# Altium footprint library MOLEX SMD.PcbLib: 54 footprints (part 2 of 4)
Each footprint in its own frame and in the unit in brackets; x right, y up, seen from the top. Pads: shape width x height; smd on the part's side, far side on the other; paste and mask are expansions set on the pad; w line width, h text height; cw(c..) or ccw(c..) is an arc to the next point about the centre after c.
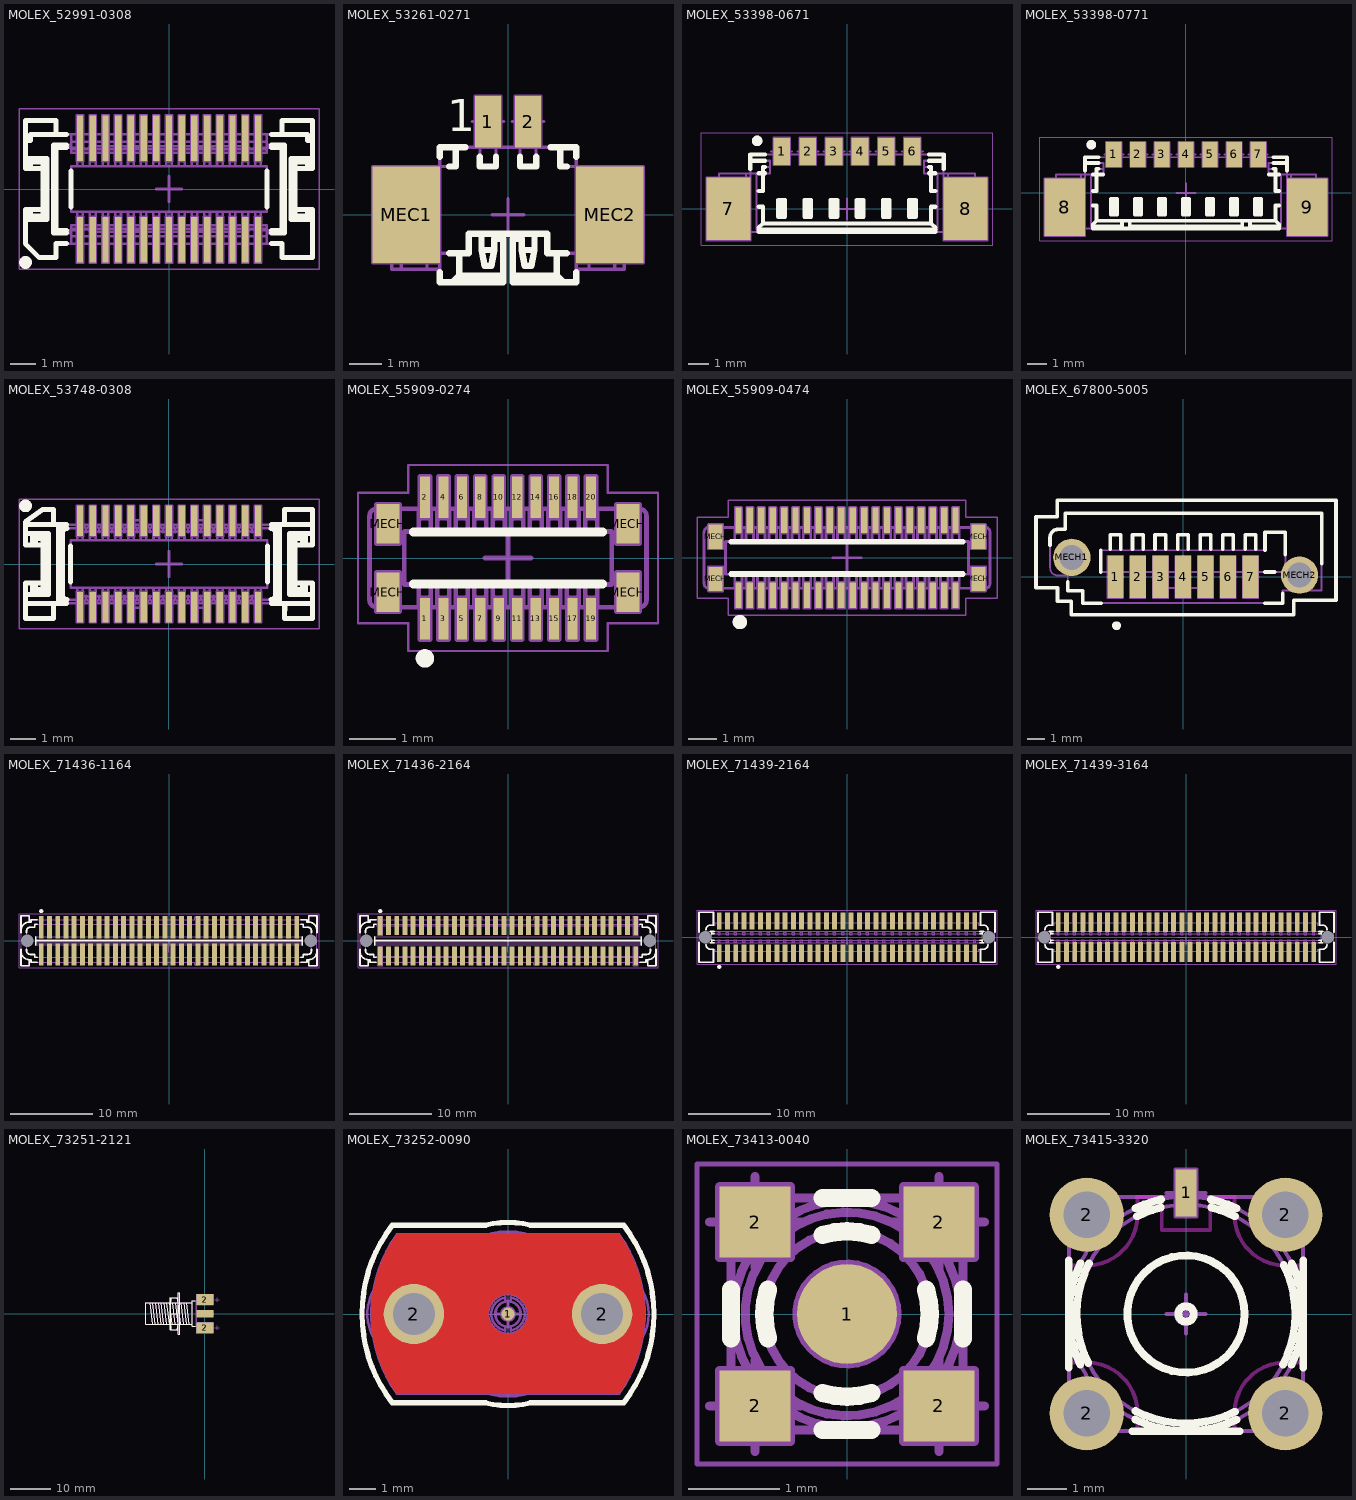
[diagram p1: the footprints below, top view; thin cyan lines are the x and y axes]

## MOLEX_52991-0308 [mm] "0.50mm Pitch SlimStack™ Dual Row 30 Circuits Surface Mount Vertical Receptacle (3.00 and 4.00mm Stacking Heights)"
height 2.27
pads (30):
  rect 0.25x1.8 smd: 1(-3.5,-2) 2(-3.5,2) 3(-3,-2) 4(-3,2) 5(-2.5,-2) 6(-2.5,2) 7(-2,-2) 8(-2,2) 9(-1.5,-2) 10(-1.5,2) 11(-1,-2) 12(-1,2) 13(-0.5,-2) 14(-0.5,2) 15(0,-2) 16(0,2) 17(0.5,-2) 18(0.5,2) 19(1,-2) 20(1,2) 21(1.5,-2) 22(1.5,2) 23(2,-2) 24(2,2) 25(2.5,-2) 26(2.5,2) 27(3,-2) 28(3,2) 29(3.5,-2) 30(3.5,2)
Top Overlay:
  circle w0.25: c-5.644,-2.889 r0.125
  lines w0.2: -5.65,-1.2 -4.81,-1.2 -4.81,1.2 -5.65,1.2 ; -5.65,1.9 -5.45,1.9 -5.45,2.15 -4.45,2.15 ; -5.525,-0.8 -5.525,-1.135 ; -5.525,0.8 -5.525,1.135 ; -5.45,-0.8 -5.45,-1.06 ; -5.45,0.8 -5.45,1.06 ; -4.025,-2.15 -4.45,-2.15 -4.45,-2.7 -5.1,-2.7 -5.65,-2.15 -5.65,-0.8 -4.95,-0.8 ; -4.025,-1.73 -4.55,-1.73 ; -4.025,-1.63 -4.45,-1.63 ; -4.025,1.63 -4.45,1.63 ; -4.025,1.73 -4.55,1.73 ; -4.025,2.15 -4.45,2.15 ; -3.85,-0.7 -3.85,0.7 ; 3.85,-0.7 3.85,0.7 ; 4.025,-2.15 4.45,-2.15 4.45,-2.7 5.65,-2.7 5.65,-0.8 ; 4.025,-1.73 4.55,-1.73 ; 4.025,-1.63 4.45,-1.63 ; 4.025,1.63 4.45,1.63 ; 4.025,1.73 4.55,1.73 ; 4.025,2.15 4.45,2.15 ; 5.45,-0.8 5.45,-1.06 ; 5.45,0.8 5.45,1.06 ; 5.525,-0.8 5.525,-1.135 ; 5.525,0.8 5.525,1.135 ; 5.65,-1.2 4.81,-1.2 4.81,1.2 5.65,1.2 ; 5.65,1.9 5.45,1.9 5.45,2.15 4.45,2.15 ; -5.525,-1.135 -4.875,-1.135 ; -5.525,-1.135 -5.45,-1.06 ; -5.525,1.135 -4.875,1.135 ; -5.525,1.135 -5.45,1.06 ; -5.45,-1.06 -4.95,-1.06 ; -5.45,1.06 -4.95,1.06 ; -4.95,-1.06 -4.95,-0.8 ; -4.95,-1.06 -4.875,-1.135 ; -4.95,-0.8 -4.95,0.8 ; -4.95,0.8 -5.65,0.8 -5.65,2.7 -4.45,2.7 -4.45,2.15 ; -4.95,0.8 -4.95,1.06 ; -4.95,1.06 -4.875,1.135 ; -4.875,-1.135 -4.875,1.135 ; -4.55,-1.73 -4.45,-1.63 ; -4.55,-1.73 -4.55,1.73 ; -4.55,1.73 -4.45,1.63 ; -4.45,-1.63 -4.45,1.63 ; 4.45,-1.63 4.55,-1.73 ; 4.45,-1.63 4.45,1.63 ; 4.45,1.63 4.55,1.73 ; 4.45,2.15 4.45,2.7 5.65,2.7 5.65,0.8 ; 4.55,-1.73 4.55,1.73 ; 4.875,-1.135 5.525,-1.135 ; 4.875,-1.135 4.95,-1.06 ; 4.875,-1.135 4.875,1.135 ; 4.875,1.135 5.525,1.135 ; 4.875,1.135 4.95,1.06 ; 4.95,-1.06 4.95,-0.8 ; 4.95,-1.06 5.45,-1.06 ; 4.95,-0.8 4.95,0.8 ; 4.95,-0.8 5.65,-0.8 ; 4.95,-0.8 5.65,-0.8 ; 4.95,0.8 5.65,0.8 ; 4.95,0.8 5.65,0.8 ; 4.95,0.8 4.95,1.06 ; 4.95,1.06 5.45,1.06 ; 5.45,-1.06 5.525,-1.135 ; 5.45,1.06 5.525,1.135
Mechanical 8:
  drawing of 184 lines, arcs and shapes, not listed
Mechanical 14:
  drawing of 228 lines, arcs and shapes, not listed
Mechanical 15:
  lines w0.05: -5.9,-3.15 -5.9,3.15 5.9,3.15 5.9,-3.15 -5.9,-3.15
3D body "MOLEX_52991-0308.stp": height 2.32, standoff 0, extent -5.65,-2.7 5.65,2.7

## MOLEX_53261-0271 [mm] "1.25mm (.049\") Pitch PicoBlade Surface Mount 2 Circuits Right Angle Header"
height 3.4
pads (4):
  rect 0.8x1.6 smd: 1(-0.625,2.9) 2(0.625,2.9)
  rect 2.1x3 smd: MEC1(-3.175,0) MEC2(3.175,0)
Top Overlay:
  lines w0.2: -2.125,-1.8 -2.125,-2.1 -0.15,-2.1 -0.15,-0.75 -0.425,-0.75 -0.425,-1.1 ; -2.125,1.8 -2.125,2.1 -1.325,2.1 ; -1.825,-1.2 -1.225,-1.2 -1.225,-0.6 1.225,-0.6 1.225,-1.2 1.825,-1.2 ; -1.825,1.5 -1.625,1.5 -1.625,2.1 ; -1.725,-2.1 -1.525,-1.9 ; -1.525,-1.2 -1.525,-1.9 ; -0.875,1.8 -0.875,1.5 -0.375,1.5 -0.375,1.8 ; -0.825,-0.6 -0.825,-1.1 ; -0.15,-1.9 -1.525,-1.9 ; 0.15,-1.9 1.525,-1.9 ; 0.375,1.8 0.375,1.5 0.875,1.5 0.875,1.8 ; 0.825,-0.6 0.825,-1.1 ; 1.325,2.1 2.125,2.1 2.125,1.8 ; 1.525,-1.2 1.525,-1.9 ; 1.625,2.1 1.625,1.5 1.825,1.5 ; 1.725,-2.1 1.525,-1.9 ; 2.125,-1.8 2.125,-2.1 0.15,-2.1 0.15,-0.75 0.425,-0.75 0.425,-1.1 ; -0.825,-1.1 -0.425,-1.1 ; -0.825,-1.1 -0.725,-1.6 -0.525,-1.6 -0.425,-1.1 ; 0.425,-1.1 0.525,-1.6 0.725,-1.6 0.825,-1.1 ; 0.425,-1.1 0.825,-1.1
  text "1" at -1.9,2.6 h1
Mechanical 8:
  lines w0.1: -3.675,0 -3.175,0 ; -3.175,-0.5 -3.175,0 ; -3.175,0.5 -3.175,0 ; -2.675,0 -3.175,0 ; -1.125,2.9 -0.625,2.9 ; -0.625,2.4 -0.625,2.9 ; -0.625,3.4 -0.625,2.9 ; -0.5,0 0,0 ; -0.125,2.9 -0.625,2.9 ; 0,-0.5 0,0 ; 0,0.5 0,0 ; 0.125,2.9 0.625,2.9 ; 0.5,0 0,0 ; 0.625,2.4 0.625,2.9 ; 0.625,3.4 0.625,2.9 ; 1.125,2.9 0.625,2.9 ; 2.675,0 3.175,0 ; 3.175,-0.5 3.175,0 ; 3.175,0.5 3.175,0 ; 3.675,0 3.175,0 ; -4.225,-1.5 -4.225,1.5 -2.125,1.5 -2.125,-1.5 -4.225,-1.5 ; -1.025,2.1 -0.225,2.1 -0.225,3.7 -1.025,3.7 -1.025,2.1 ; 0.225,2.1 0.225,3.7 1.025,3.7 1.025,2.1 0.225,2.1 ; 2.125,-1.5 4.225,-1.5 4.225,1.5 2.125,1.5 2.125,-1.5
Mechanical 14:
  lines w0.1: -3.625,-1.1 -3.825,-0.9 -3.825,0.9 -3.625,1.1 ; -3.325,-1.7 -3.325,1.1 ; -2.525,-1.7 -2.525,1.1 ; -2.145,1.1 -3.625,1.1 ; -2.125,-1.7 -3.625,-1.7 -3.625,1.1 ; -2.125,-1.2 -1.225,-1.2 -1.225,-0.6 1.225,-0.6 1.225,-1.2 2.125,-1.2 ; -2.125,1.5 -1.625,1.5 -1.625,2.1 ; -1.725,-2.1 -1.525,-1.9 ; -1.525,-1.2 -1.525,-1.9 ; -0.875,2.1 -0.875,1.5 -0.375,1.5 -0.375,2.1 ; -0.825,-0.6 -0.825,-1.1 ; -0.785,2.1 -0.785,3.1 -0.465,3.1 -0.465,2.1 ; -0.15,-1.9 -1.525,-1.9 ; 0.15,-1.9 1.525,-1.9 ; 0.375,2.1 0.375,1.5 0.875,1.5 0.875,2.1 ; 0.465,2.1 0.465,3.1 0.785,3.1 0.785,2.1 ; 0.825,-0.6 0.825,-1.1 ; 1.525,-1.2 1.525,-1.9 ; 1.625,2.1 1.625,1.5 2.125,1.5 ; 1.725,-2.1 1.525,-1.9 ; 2.125,-1.7 3.625,-1.7 3.625,1.1 ; 2.125,1.1 3.625,1.1 ; 2.525,-1.7 2.525,1.1 ; 3.325,-1.7 3.325,1.1 ; 3.625,-1.1 3.825,-0.9 3.825,0.9 3.625,1.1 ; -0.825,-1.1 -0.425,-1.1 ; -0.825,-1.1 -0.725,-1.6 -0.525,-1.6 -0.425,-1.1 ; -0.425,-1.1 -0.425,-0.75 -0.15,-0.75 -0.15,-2.1 -2.125,-2.1 -2.125,2.1 2.125,2.1 2.125,-2.1 0.15,-2.1 0.15,-0.75 0.425,-0.75 0.425,-1.1 ; 0.425,-1.1 0.525,-1.6 0.725,-1.6 0.825,-1.1 ; 0.425,-1.1 0.825,-1.1
  text "1" at -1.9,2.6 h1
3D body "MOLEX_53261-0271.stp": height 3.4, standoff 0, extent -3.825,-2.1 3.825,3.1

## MOLEX_53398-0671 [mm] "1.25mm (.049\") Pitch PicoBlade Surface Mount 6 Circuits Straight Header"
height 4.7
pads (8):
  rect 0.8x1.3 smd: 1(-3.125,2.75) 2(-1.875,2.75) 3(-0.625,2.75) 4(0.625,2.75) 5(1.875,2.75) 6(3.125,2.75)
  rect 2.1x3 smd: 7(-5.675,0) 8(5.675,0)
Top Overlay:
  circle w0.25: c-4.3,3.25 r0.125
  lines w0.2: -4.625,1.9 -4.625,2.6 -3.925,2.6 ; -4.625,2.3 -3.925,2.3 ; -4.225,-1.1 4.225,-1.1 ; -4.225,-1 4.225,-1 ; -4.225,-0.9 -4.025,-0.7 ; -4.225,0.1 -4.025,0.1 -4.025,-0.7 ; -4.225,0.85 -4.025,0.85 -4.025,2 -3.925,2 ; -4.225,1.7 -4.025,1.7 -3.925,1.7 ; 3.925,1.7 4.225,1.7 ; 3.925,2 4.025,2 4.025,0.85 4.225,0.85 ; 3.925,2.3 4.625,2.3 ; 3.925,2.6 4.625,2.6 4.625,1.9 ; 4.225,-0.9 4.025,-0.7 ; 4.225,0.1 4.025,0.1 4.025,-0.7 ; -4.025,-0.7 4.025,-0.7 ; -3.285,-0.375 -3.185,-0.275 ; -3.285,-0.375 -3.285,0.425 ; -3.285,-0.375 -2.965,-0.375 ; -3.285,0.425 -3.185,0.325 ; -3.285,0.425 -2.965,0.425 ; -3.185,-0.275 -3.185,0.325 ; -3.185,-0.275 -3.065,-0.275 ; -3.185,0.325 -3.065,0.325 ; -3.065,-0.275 -3.065,0.325 ; -3.065,-0.275 -2.965,-0.375 ; -3.065,0.325 -2.965,0.425 ; -2.965,-0.375 -2.965,0.425 ; -2.035,-0.375 -1.935,-0.275 ; -2.035,-0.375 -2.035,0.425 ; -2.035,-0.375 -1.715,-0.375 ; -2.035,0.425 -1.935,0.325 ; -2.035,0.425 -1.715,0.425 ; -1.935,-0.275 -1.935,0.325 ; -1.935,-0.275 -1.815,-0.275 ; -1.935,0.325 -1.815,0.325 ; -1.815,-0.275 -1.815,0.325 ; -1.815,-0.275 -1.715,-0.375 ; -1.815,0.325 -1.715,0.425 ; -1.715,-0.375 -1.715,0.425 ; -0.785,-0.375 -0.685,-0.275 ; -0.785,-0.375 -0.785,0.425 ; -0.785,-0.375 -0.465,-0.375 ; -0.785,0.425 -0.685,0.325 ; -0.785,0.425 -0.465,0.425 ; -0.685,-0.275 -0.685,0.325 ; -0.685,-0.275 -0.565,-0.275 ; -0.685,0.325 -0.565,0.325 ; -0.565,-0.275 -0.565,0.325 ; -0.565,-0.275 -0.465,-0.375 ; -0.565,0.325 -0.465,0.425 ; -0.465,-0.375 -0.465,0.425 ; 0.465,-0.375 0.565,-0.275 ; 0.465,-0.375 0.465,0.425 ; 0.465,-0.375 0.785,-0.375 ; 0.465,0.425 0.565,0.325 ; 0.465,0.425 0.785,0.425 ; 0.565,-0.275 0.565,0.325 ; 0.565,-0.275 0.685,-0.275 ; 0.565,0.325 0.685,0.325 ; 0.685,-0.275 0.685,0.325 ; 0.685,-0.275 0.785,-0.375 ; 0.685,0.325 0.785,0.425 ; 0.785,-0.375 0.785,0.425 ; 1.715,-0.375 1.815,-0.275 ; 1.715,-0.375 1.715,0.425 ; 1.715,-0.375 2.035,-0.375 ; 1.715,0.425 1.815,0.325 ; 1.715,0.425 2.035,0.425 ; 1.815,-0.275 1.815,0.325 ; 1.815,-0.275 1.935,-0.275 ; 1.815,0.325 1.935,0.325 ; 1.935,-0.275 1.935,0.325 ; 1.935,-0.275 2.035,-0.375 ; 1.935,0.325 2.035,0.425 ; 2.035,-0.375 2.035,0.425 ; 2.965,-0.375 3.065,-0.275 ; 2.965,-0.375 2.965,0.425 ; 2.965,-0.375 3.285,-0.375 ; 2.965,0.425 3.065,0.325 ; 2.965,0.425 3.285,0.425 ; 3.065,-0.275 3.065,0.325 ; 3.065,-0.275 3.185,-0.275 ; 3.065,0.325 3.185,0.325 ; 3.185,-0.275 3.185,0.325 ; 3.185,-0.275 3.285,-0.375 ; 3.185,0.325 3.285,0.425 ; 3.285,-0.375 3.285,0.425
Mechanical 8:
  lines w0.1: -6.175,0 -5.675,0 ; -5.675,-0.5 -5.675,0 ; -5.675,0.5 -5.675,0 ; -5.175,0 -5.675,0 ; -3.625,2.75 -3.125,2.75 ; -3.125,2.25 -3.125,2.75 ; -3.125,3.25 -3.125,2.75 ; -2.625,2.75 -3.125,2.75 ; -2.375,2.75 -1.875,2.75 ; -1.875,2.25 -1.875,2.75 ; -1.875,3.25 -1.875,2.75 ; -1.375,2.75 -1.875,2.75 ; -1.125,2.75 -0.625,2.75 ; -0.625,2.25 -0.625,2.75 ; -0.625,3.25 -0.625,2.75 ; -0.5,0 0,0 ; -0.125,2.75 -0.625,2.75 ; 0,-0.5 0,0 ; 0,0.5 0,0 ; 0.125,2.75 0.625,2.75 ; 0.5,0 0,0 ; 0.625,2.25 0.625,2.75 ; 0.625,3.25 0.625,2.75 ; 1.125,2.75 0.625,2.75 ; 1.375,2.75 1.875,2.75 ; 1.875,2.25 1.875,2.75 ; 1.875,3.25 1.875,2.75 ; 2.375,2.75 1.875,2.75 ; 2.625,2.75 3.125,2.75 ; 3.125,2.25 3.125,2.75 ; 3.125,3.25 3.125,2.75 ; 3.625,2.75 3.125,2.75 ; 5.175,0 5.675,0 ; 5.675,-0.5 5.675,0 ; 5.675,0.5 5.675,0 ; 6.175,0 5.675,0 ; -6.725,-1.5 -6.725,1.5 -4.625,1.5 -4.625,-1.5 -6.725,-1.5 ; -3.525,2.1 -3.525,3.4 -2.725,3.4 -2.725,2.1 -3.525,2.1 ; -2.275,2.1 -2.275,3.4 -1.475,3.4 -1.475,2.1 -2.275,2.1 ; -1.025,2.1 -1.025,3.4 -0.225,3.4 -0.225,2.1 -1.025,2.1 ; 0.225,2.1 0.225,3.4 1.025,3.4 1.025,2.1 0.225,2.1 ; 1.475,2.1 1.475,3.4 2.275,3.4 2.275,2.1 1.475,2.1 ; 2.725,2.1 2.725,3.4 3.525,3.4 3.525,2.1 2.725,2.1 ; 4.625,-1.5 4.625,1.5 6.725,1.5 6.725,-1.5 4.625,-1.5
Mechanical 14:
  circle w0.25: c-4.3,3.25 r0.125
  lines w0.1: -6.125,1.1 -6.325,0.9 -6.325,-0.9 -6.125,-1.1 ; -4.825,-1.1 -4.825,1.7 ; -4.625,-1.1 -4.625,2.6 4.625,2.6 4.625,-1.1 ; -4.625,2.3 -3.675,2.3 -3.675,1.7 -4.025,1.7 -6.125,1.7 -6.125,-1.1 ; -4.325,0.1 -4.025,0.1 -4.025,-0.7 ; -4.325,0.85 -4.025,0.85 -4.025,2 -3.675,2 ; -4.325,1.7 -4.325,-1 ; 3.675,2 4.025,2 4.025,0.85 4.325,0.85 ; 4.325,0.1 4.025,0.1 4.025,-0.7 ; 4.325,1.7 4.325,-1 ; 4.625,2.3 3.675,2.3 3.675,1.7 6.125,1.7 6.125,-1.1 ; 4.825,-1.1 4.825,1.7 ; 6.125,1.1 6.325,0.9 6.325,-0.9 6.125,-1.1 ; -6.125,-1.1 6.125,-1.1 ; -4.325,-1 4.325,-1 ; -4.325,-1 -4.025,-0.7 ; -4.025,-0.7 4.025,-0.7 ; -3.285,-0.375 -3.185,-0.275 ; -3.285,-0.375 -3.285,0.425 ; -3.285,-0.375 -2.965,-0.375 ; -3.285,0.425 -3.185,0.325 ; -3.285,0.425 -2.965,0.425 ; -3.185,-0.275 -3.185,0.325 ; -3.185,-0.275 -3.065,-0.275 ; -3.185,0.325 -3.065,0.325 ; -3.065,-0.275 -3.065,0.325 ; -3.065,-0.275 -2.965,-0.375 ; -3.065,0.325 -2.965,0.425 ; -2.965,-0.375 -2.965,0.425 ; -2.035,-0.375 -1.935,-0.275 ; -2.035,-0.375 -2.035,0.425 ; -2.035,-0.375 -1.715,-0.375 ; -2.035,0.425 -1.935,0.325 ; -2.035,0.425 -1.715,0.425 ; -1.935,-0.275 -1.935,0.325 ; -1.935,-0.275 -1.815,-0.275 ; -1.935,0.325 -1.815,0.325 ; -1.815,-0.275 -1.815,0.325 ; -1.815,-0.275 -1.715,-0.375 ; -1.815,0.325 -1.715,0.425 ; -1.715,-0.375 -1.715,0.425 ; -0.785,-0.375 -0.685,-0.275 ; -0.785,-0.375 -0.785,0.425 ; -0.785,-0.375 -0.465,-0.375 ; -0.785,0.425 -0.685,0.325 ; -0.785,0.425 -0.465,0.425 ; -0.685,-0.275 -0.685,0.325 ; -0.685,-0.275 -0.565,-0.275 ; -0.685,0.325 -0.565,0.325 ; -0.565,-0.275 -0.565,0.325 ; -0.565,-0.275 -0.465,-0.375 ; -0.565,0.325 -0.465,0.425 ; -0.465,-0.375 -0.465,0.425 ; 0.465,-0.375 0.565,-0.275 ; 0.465,-0.375 0.465,0.425 ; 0.465,-0.375 0.785,-0.375 ; 0.465,0.425 0.565,0.325 ; 0.465,0.425 0.785,0.425 ; 0.565,-0.275 0.565,0.325 ; 0.565,-0.275 0.685,-0.275 ; 0.565,0.325 0.685,0.325 ; 0.685,-0.275 0.685,0.325 ; 0.685,-0.275 0.785,-0.375 ; 0.685,0.325 0.785,0.425 ; 0.785,-0.375 0.785,0.425 ; 1.715,-0.375 1.815,-0.275 ; 1.715,-0.375 1.715,0.425 ; 1.715,-0.375 2.035,-0.375 ; 1.715,0.425 1.815,0.325 ; 1.715,0.425 2.035,0.425 ; 1.815,-0.275 1.815,0.325 ; 1.815,-0.275 1.935,-0.275 ; 1.815,0.325 1.935,0.325 ; 1.935,-0.275 1.935,0.325 ; 1.935,-0.275 2.035,-0.375 ; 1.935,0.325 2.035,0.425 ; 2.035,-0.375 2.035,0.425 ; 2.965,-0.375 3.065,-0.275 ; 2.965,-0.375 2.965,0.425 ; 2.965,-0.375 3.285,-0.375 ; 2.965,0.425 3.065,0.325 ; 2.965,0.425 3.285,0.425 ; 3.065,-0.275 3.065,0.325 ; 3.065,-0.275 3.185,-0.275 ; 3.065,0.325 3.185,0.325 ; 3.185,-0.275 3.185,0.325 ; 3.185,-0.275 3.285,-0.375 ; 3.185,0.325 3.285,0.425 ; 3.285,-0.375 3.285,0.425 ; 4.025,-0.7 4.325,-1
Mechanical 15:
  lines w0.05: -6.975,-1.75 -6.975,3.65 6.975,3.65 6.975,-1.75 -6.975,-1.75
3D body "MOLEX_53398-0671.stp": height 4.7, standoff 0, extent -6.325,-1.1 6.325,3.1

## MOLEX_53398-0771 [mm] "1.25mm (.049\") Pitch PicoBlade Surface Mount 7 Circuits Straight Header"
height 4.7
pads (9):
  rect 0.8x1.3 smd: 1(-3.75,2) 2(-2.5,2) 3(-1.25,2) 4(0,2) 5(1.25,2) 6(2.5,2) 7(3.75,2)
  rect 2.1x3 smd: 8(-6.3,-0.75) 9(6.3,-0.75)
Top Overlay:
  circle w0.25: c-4.925,2.5 r0.125
  lines w0.2: -5.25,1.15 -5.25,1.85 -4.55,1.85 ; -5.25,1.55 -4.55,1.55 ; -4.85,-1.85 4.85,-1.85 ; -4.85,-1.75 -3.325,-1.75 ; -4.85,-1.65 -4.65,-1.45 ; -4.85,-0.65 -4.65,-0.65 -4.65,-1.45 ; -4.85,0.1 -4.65,0.1 -4.65,1.25 -4.55,1.25 ; -4.85,0.95 -4.3,0.95 ; -3.325,-1.85 -3.325,-1.45 ; -2.925,-1.85 -2.925,-1.45 ; -2.925,-1.75 2.925,-1.75 ; 2.925,-1.85 2.925,-1.45 ; 3.325,-1.85 3.325,-1.45 ; 3.325,-1.75 4.85,-1.75 ; 4.3,0.95 4.85,0.95 ; 4.55,1.25 4.65,1.25 4.65,0.1 4.85,0.1 ; 4.55,1.55 5.25,1.55 ; 4.55,1.85 5.25,1.85 5.25,1.15 ; 4.85,-1.65 4.65,-1.45 ; 4.85,-0.65 4.65,-0.65 4.65,-1.45 ; -4.65,-1.45 4.65,-1.45 ; -3.91,-1.125 -3.81,-1.025 ; -3.91,-1.125 -3.59,-1.125 ; -3.91,-1.125 -3.91,-0.325 ; -3.91,-0.325 -3.81,-0.425 ; -3.91,-0.325 -3.59,-0.325 ; -3.81,-1.025 -3.81,-0.425 ; -3.81,-1.025 -3.69,-1.025 ; -3.81,-0.425 -3.69,-0.425 ; -3.69,-1.025 -3.69,-0.425 ; -3.69,-1.025 -3.59,-1.125 ; -3.69,-0.425 -3.59,-0.325 ; -3.59,-1.125 -3.59,-0.325 ; -2.66,-1.125 -2.56,-1.025 ; -2.66,-1.125 -2.34,-1.125 ; -2.66,-1.125 -2.66,-0.325 ; -2.66,-0.325 -2.56,-0.425 ; -2.66,-0.325 -2.34,-0.325 ; -2.56,-1.025 -2.56,-0.425 ; -2.56,-1.025 -2.44,-1.025 ; -2.56,-0.425 -2.44,-0.425 ; -2.44,-1.025 -2.44,-0.425 ; -2.44,-1.025 -2.34,-1.125 ; -2.44,-0.425 -2.34,-0.325 ; -2.34,-1.125 -2.34,-0.325 ; -1.41,-1.125 -1.31,-1.025 ; -1.41,-1.125 -1.09,-1.125 ; -1.41,-1.125 -1.41,-0.325 ; -1.41,-0.325 -1.31,-0.425 ; -1.41,-0.325 -1.09,-0.325 ; -1.31,-1.025 -1.31,-0.425 ; -1.31,-1.025 -1.19,-1.025 ; -1.31,-0.425 -1.19,-0.425 ; -1.19,-1.025 -1.19,-0.425 ; -1.19,-1.025 -1.09,-1.125 ; -1.19,-0.425 -1.09,-0.325 ; -1.09,-1.125 -1.09,-0.325 ; -0.16,-1.125 -0.06,-1.025 ; -0.16,-1.125 0.16,-1.125 ; -0.16,-1.125 -0.16,-0.325 ; -0.16,-0.325 -0.06,-0.425 ; -0.16,-0.325 0.16,-0.325 ; -0.06,-1.025 -0.06,-0.425 ; -0.06,-1.025 0.06,-1.025 ; -0.06,-0.425 0.06,-0.425 ; 0.06,-1.025 0.06,-0.425 ; 0.06,-1.025 0.16,-1.125 ; 0.06,-0.425 0.16,-0.325 ; 0.16,-1.125 0.16,-0.325 ; 1.09,-1.125 1.19,-1.025 ; 1.09,-1.125 1.41,-1.125 ; 1.09,-1.125 1.09,-0.325 ; 1.09,-0.325 1.19,-0.425 ; 1.09,-0.325 1.41,-0.325 ; 1.19,-1.025 1.19,-0.425 ; 1.19,-1.025 1.31,-1.025 ; 1.19,-0.425 1.31,-0.425 ; 1.31,-1.025 1.31,-0.425 ; 1.31,-1.025 1.41,-1.125 ; 1.31,-0.425 1.41,-0.325 ; 1.41,-1.125 1.41,-0.325 ; 2.34,-1.125 2.44,-1.025 ; 2.34,-1.125 2.66,-1.125 ; 2.34,-1.125 2.34,-0.325 ; 2.34,-0.325 2.44,-0.425 ; 2.34,-0.325 2.66,-0.325 ; 2.44,-1.025 2.44,-0.425 ; 2.44,-1.025 2.56,-1.025 ; 2.44,-0.425 2.56,-0.425 ; 2.56,-1.025 2.56,-0.425 ; 2.56,-1.025 2.66,-1.125 ; 2.56,-0.425 2.66,-0.325 ; 2.66,-1.125 2.66,-0.325 ; 3.59,-1.125 3.69,-1.025 ; 3.59,-1.125 3.91,-1.125 ; 3.59,-1.125 3.59,-0.325 ; 3.59,-0.325 3.69,-0.425 ; 3.59,-0.325 3.91,-0.325 ; 3.69,-1.025 3.69,-0.425 ; 3.69,-1.025 3.81,-1.025 ; 3.69,-0.425 3.81,-0.425 ; 3.81,-1.025 3.81,-0.425 ; 3.81,-1.025 3.91,-1.125 ; 3.81,-0.425 3.91,-0.325 ; 3.91,-1.125 3.91,-0.325
Mechanical 8:
  lines w0.1: -6.8,-0.75 -6.3,-0.75 ; -6.3,-1.25 -6.3,-0.75 ; -6.3,-0.25 -6.3,-0.75 ; -5.8,-0.75 -6.3,-0.75 ; -4.25,2 -3.75,2 ; -3.75,1.5 -3.75,2 ; -3.75,2.5 -3.75,2 ; -3.25,2 -3.75,2 ; -3,2 -2.5,2 ; -2.5,1.5 -2.5,2 ; -2.5,2.5 -2.5,2 ; -2,2 -2.5,2 ; -1.75,2 -1.25,2 ; -1.25,1.5 -1.25,2 ; -1.25,2.5 -1.25,2 ; -0.75,2 -1.25,2 ; -0.5,0 0,0 ; -0.5,2 0,2 ; 0,-0.5 0,0 ; 0,0.5 0,0 ; 0,1.5 0,2 ; 0,2.35 0,2.65 ; 0,2.5 0,2 ; 0.5,0 0,0 ; 0.5,2 0,2 ; 0.75,2 1.25,2 ; 1.25,1.5 1.25,2 ; 1.25,2.5 1.25,2 ; 1.75,2 1.25,2 ; 2,2 2.5,2 ; 2.5,1.5 2.5,2 ; 2.5,2.5 2.5,2 ; 3,2 2.5,2 ; 3.25,2 3.75,2 ; 3.75,1.5 3.75,2 ; 3.75,2.5 3.75,2 ; 4.25,2 3.75,2 ; 5.8,-0.75 6.3,-0.75 ; 6.3,-1.25 6.3,-0.75 ; 6.3,-0.25 6.3,-0.75 ; 6.8,-0.75 6.3,-0.75 ; -7.35,-2.25 -7.35,0.75 -5.25,0.75 -5.25,-2.25 -7.35,-2.25 ; -4.15,1.35 -4.15,2.65 -3.35,2.65 -3.35,1.35 -4.15,1.35 ; -2.9,1.35 -2.9,2.65 -2.1,2.65 -2.1,1.35 -2.9,1.35 ; -1.65,1.35 -1.65,2.65 -0.85,2.65 -0.85,1.35 -1.65,1.35 ; -0.4,1.35 -0.4,2.65 0.4,2.65 0.4,1.35 -0.4,1.35 ; 0.85,1.35 0.85,2.65 1.65,2.65 1.65,1.35 0.85,1.35 ; 2.1,1.35 2.1,2.65 2.9,2.65 2.9,1.35 2.1,1.35 ; 3.35,1.35 3.35,2.65 4.15,2.65 4.15,1.35 3.35,1.35 ; 5.25,-2.25 5.25,0.75 7.35,0.75 7.35,-2.25 5.25,-2.25
Mechanical 14:
  drawing of 155 lines, arcs and shapes, not listed
Mechanical 15:
  lines w0.05: -7.6,-2.5 -7.6,2.9 7.6,2.9 7.6,-2.5 -7.6,-2.5
3D body "MOLEX_53398-0771.stp": height 4.7, standoff 0, extent -6.95,-1.85 6.95,2.35

## MOLEX_53748-0308 [mm] "0.50mm Pitch SlimStack Dual Row 30 Circuits Surface Mount Vertical Plug (3.00mm Stacking Heights)"
height 2.4
pads (30):
  rect 0.25x1.2 smd: 1(-3.5,1.7) 2(-3.5,-1.7) 3(-3,1.7) 4(-3,-1.7) 5(-2.5,1.7) 6(-2.5,-1.7) 7(-2,1.7) 8(-2,-1.7) 9(-1.5,1.7) 10(-1.5,-1.7) 11(-1,1.7) 12(-1,-1.7) 13(-0.5,1.7) 14(-0.5,-1.7) 15(0,1.7) 16(0,-1.7) 17(0.5,1.7) 18(0.5,-1.7) 19(1,1.7) 20(1,-1.7) 21(1.5,1.7) 22(1.5,-1.7) 23(2,1.7) 24(2,-1.7) 25(2.5,1.7) 26(2.5,-1.7) 27(3,1.7) 28(3,-1.7) 29(3.5,1.7) 30(3.5,-1.7)
Top Overlay:
  circle w0.25: c-5.644,2.286 r0.125
  lines w0.2: -5.65,-1.55 -4.025,-1.55 ; -5.65,-1.2 -4.75,-1.2 -4.75,1.2 -5.65,1.2 ; -5.65,1.55 -4.025,1.55 ; -5.37,-0.75 -5.37,-1.12 ; -5.37,0.75 -5.37,1.12 ; -5.25,-0.75 -5.25,-1 ; -5.25,0.75 -5.25,1 ; -4.95,-0.75 -5.65,-0.75 -5.65,-2.15 -4.55,-2.15 -4.55,-1.55 ; -4.95,0.75 -5.65,0.75 -5.65,1.66 -4.95,2.15 -4.55,2.15 -4.55,1.55 ; -4.35,-1.36 -4.2,-1.21 ; -4.35,1.36 -4.2,1.21 ; -4.16,-1.55 -4.01,-1.4 cw(c-4.014,-1.214) -4.2,-1.21 ; -4.16,1.55 -4.01,1.4 ccw(c-4.014,1.214) -4.2,1.21 ; -4.15,-1.55 cw(c-4.15,-1.35) -4.35,-1.35 -4.35,1.35 cw(c-4.15,1.35) -4.15,1.55 ; -3.87,-0.7 -3.87,0.7 ; 3.87,-0.7 3.87,0.7 ; 4.025,-1.55 5.65,-1.55 ; 4.025,1.55 5.65,1.55 ; 4.15,-1.55 ccw(c4.15,-1.35) 4.35,-1.36 ; 4.16,-1.55 4.01,-1.4 ccw(c4.014,-1.214) 4.2,-1.21 ; 4.35,1.359 ccw(c4.15,1.35) 4.16,1.55 4.01,1.4 cw(c4.014,1.214) 4.2,1.21 ; 4.55,1.55 4.55,2.15 5.65,2.15 5.65,0.75 4.95,0.75 ; 4.552,-1.55 4.55,-2.15 5.65,-2.15 5.65,-0.75 4.95,-0.75 ; 5.25,-0.75 5.25,-1 ; 5.25,0.75 5.25,1 ; 5.37,-0.75 5.37,-1.12 ; 5.37,0.75 5.37,1.12 ; 5.65,-1.2 4.75,-1.2 4.75,1.2 5.65,1.2 ; -5.37,-1.12 -5.25,-1 ; -5.37,-1.12 -4.83,-1.12 ; -5.37,1.12 -5.25,1 ; -5.37,1.12 -4.83,1.12 ; -5.25,-1 -4.95,-1 ; -5.25,1 -4.95,1 ; -4.95,-1 -4.83,-1.12 ; -4.95,-1 -4.95,1 ; -4.95,1 -4.83,1.12 ; -4.83,-1.12 -4.83,1.12 ; -4.2,-1.21 -4.2,1.21 ; 4.2,-1.21 4.2,1.21 ; 4.2,-1.21 4.35,-1.36 ; 4.2,1.21 4.35,1.36 4.35,-1.36 ; 4.83,-1.12 4.83,1.12 ; 4.83,-1.12 5.37,-1.12 ; 4.83,-1.12 4.95,-1 ; 4.83,1.12 4.95,1 ; 4.83,1.12 5.37,1.12 ; 4.95,-1 5.25,-1 ; 4.95,-1 4.95,1 ; 4.95,1 5.25,1 ; 5.25,-1 5.37,-1.12 ; 5.25,1 5.37,1.12
Mechanical 8:
  drawing of 184 lines, arcs and shapes, not listed
Mechanical 14:
  drawing of 354 lines, arcs and shapes, not listed
Mechanical 15:
  lines w0.05: -5.9,-2.55 5.9,-2.55 5.9,2.55 -5.9,2.55 -5.9,-2.55
3D body "MOLEX_53748-0308.stp": height 2.42, standoff 0, extent -5.65,-2.15 5.65,2.15

## MOLEX_55909-0274 [mm] "0.40mm Pitch SlimStack Dual Row 20 Circuits Surface Mount Vertical Plug"
height 1.14
pads (24):
  rect 0.22x0.9 smd: 1(-1.8,-1.315) 2(-1.8,1.315) 3(-1.4,-1.315) 4(-1.4,1.315) 5(-1,-1.315) 6(-1,1.315) 7(-0.6,-1.315) 8(-0.6,1.315) 9(-0.2,-1.315) 10(-0.2,1.315) 11(0.2,-1.315) 12(0.2,1.315) 13(0.6,-1.315) 14(0.6,1.315) 15(1,-1.315) 16(1,1.315) 17(1.4,-1.315) 18(1.4,1.315) 19(1.8,-1.315) 20(1.8,1.315)
  rect 0.5x0.85 smd: MECH(-2.6,-0.74) MECH(-2.6,0.74) MECH(2.6,-0.74) MECH(2.6,0.74)
Top Overlay:
  circle w0.2: c-1.8,-2.175 r0.1
  lines w0.2: -2.05,-0.565 2.05,-0.565 ; -2.05,0.565 2.05,0.565
Mechanical 8:
  lines w0.1: -0.5,0 0,0 ; 0,-0.5 0,0 ; 0,0.5 0,0 ; 0.5,0 0,0 ; -2.85,-1.165 -2.6,-0.74 -2.85,-0.315 ; -2.85,-1.165 -2.35,-1.165 -2.35,-0.315 -2.85,-0.315 ; -2.85,-1.165 -2.85,-0.315 ; -2.85,0.315 -2.6,0.74 -2.85,1.165 ; -2.85,0.315 -2.35,0.315 -2.35,1.165 -2.85,1.165 ; -2.85,0.315 -2.85,1.165 ; -1.91,-1.765 -1.8,-1.315 -1.69,-1.765 ; -1.91,-1.765 -1.91,-0.865 -1.69,-0.865 -1.69,-1.765 ; -1.91,-1.765 -1.69,-1.765 ; -1.91,1.765 -1.8,1.315 -1.69,1.765 ; -1.91,1.765 -1.69,1.765 ; -1.91,1.765 -1.91,0.865 -1.69,0.865 -1.69,1.765 ; -1.51,-1.765 -1.4,-1.315 -1.29,-1.765 ; -1.51,-1.765 -1.51,-0.865 -1.29,-0.865 -1.29,-1.765 ; -1.51,-1.765 -1.29,-1.765 ; -1.51,1.765 -1.4,1.315 -1.29,1.765 ; -1.51,1.765 -1.29,1.765 ; -1.51,1.765 -1.51,0.865 -1.29,0.865 -1.29,1.765 ; -1.11,-1.765 -1,-1.315 -0.89,-1.765 ; -1.11,-1.765 -1.11,-0.865 -0.89,-0.865 -0.89,-1.765 ; -1.11,-1.765 -0.89,-1.765 ; -1.11,1.765 -1,1.315 -0.89,1.765 ; -1.11,1.765 -0.89,1.765 ; -1.11,1.765 -1.11,0.865 -0.89,0.865 -0.89,1.765 ; -0.71,-1.765 -0.6,-1.315 -0.49,-1.765 ; -0.71,-1.765 -0.71,-0.865 -0.49,-0.865 -0.49,-1.765 ; -0.71,-1.765 -0.49,-1.765 ; -0.71,1.765 -0.6,1.315 -0.49,1.765 ; -0.71,1.765 -0.49,1.765 ; -0.71,1.765 -0.71,0.865 -0.49,0.865 -0.49,1.765 ; -0.31,-1.765 -0.2,-1.315 -0.09,-1.765 ; -0.31,-1.765 -0.31,-0.865 -0.09,-0.865 -0.09,-1.765 ; -0.31,-1.765 -0.09,-1.765 ; -0.31,1.765 -0.2,1.315 -0.09,1.765 ; -0.31,1.765 -0.09,1.765 ; -0.31,1.765 -0.31,0.865 -0.09,0.865 -0.09,1.765 ; 0.09,-1.765 0.2,-1.315 0.31,-1.765 ; 0.09,-1.765 0.09,-0.865 0.31,-0.865 0.31,-1.765 ; 0.09,-1.765 0.31,-1.765 ; 0.09,1.765 0.2,1.315 0.31,1.765 ; 0.09,1.765 0.31,1.765 ; 0.09,1.765 0.09,0.865 0.31,0.865 0.31,1.765 ; 0.49,-1.765 0.6,-1.315 0.71,-1.765 ; 0.49,-1.765 0.49,-0.865 0.71,-0.865 0.71,-1.765 ; 0.49,-1.765 0.71,-1.765 ; 0.49,1.765 0.6,1.315 0.71,1.765 ; 0.49,1.765 0.71,1.765 ; 0.49,1.765 0.49,0.865 0.71,0.865 0.71,1.765 ; 0.89,-1.765 1,-1.315 1.11,-1.765 ; 0.89,-1.765 0.89,-0.865 1.11,-0.865 1.11,-1.765 ; 0.89,-1.765 1.11,-1.765 ; 0.89,1.765 1,1.315 1.11,1.765 ; 0.89,1.765 1.11,1.765 ; 0.89,1.765 0.89,0.865 1.11,0.865 1.11,1.765 ; 1.29,-1.765 1.4,-1.315 1.51,-1.765 ; 1.29,-1.765 1.29,-0.865 1.51,-0.865 1.51,-1.765 ; 1.29,-1.765 1.51,-1.765 ; 1.29,1.765 1.4,1.315 1.51,1.765 ; 1.29,1.765 1.51,1.765 ; 1.29,1.765 1.29,0.865 1.51,0.865 1.51,1.765 ; 1.69,-1.765 1.8,-1.315 1.91,-1.765 ; 1.69,-1.765 1.69,-0.865 1.91,-0.865 1.91,-1.765 ; 1.69,-1.765 1.91,-1.765 ; 1.69,1.765 1.8,1.315 1.91,1.765 ; 1.69,1.765 1.91,1.765 ; 1.69,1.765 1.69,0.865 1.91,0.865 1.91,1.765 ; 2.85,-1.165 2.6,-0.74 2.85,-0.315 ; 2.85,-1.165 2.35,-1.165 2.35,-0.315 2.85,-0.315 ; 2.85,-1.165 2.85,-0.315 ; 2.85,0.315 2.6,0.74 2.85,1.165 ; 2.85,0.315 2.35,0.315 2.35,1.165 2.85,1.165 ; 2.85,0.315 2.85,1.165